# Altium footprint library IntegratedPcbLib.PcbLib: 81 footprints (part 5 of 6)
Each footprint in its own frame and in the unit in brackets; x right, y up, seen from the top. Pads: shape width x height; smd on the part's side, far side on the other; paste and mask are expansions set on the pad; w line width, h text height; cw(c..) or ccw(c..) is an arc to the next point about the centre after c.
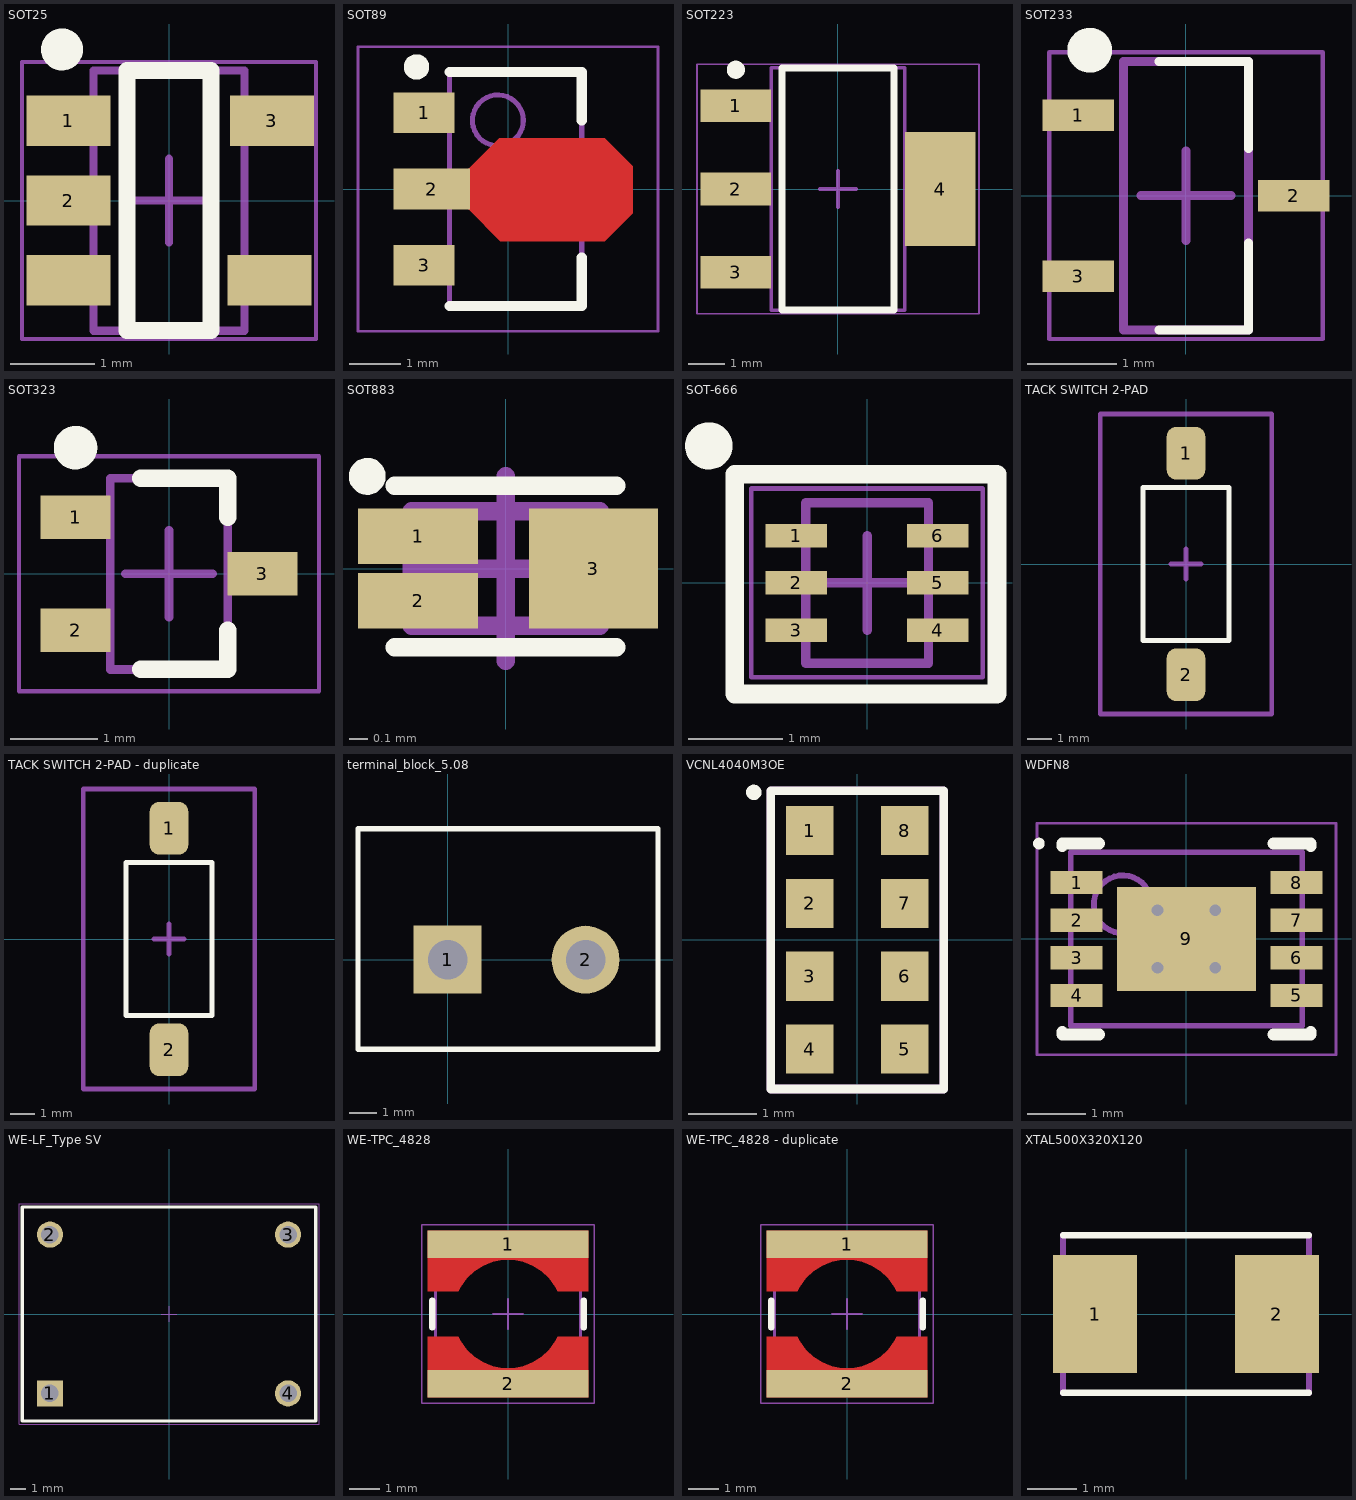
[diagram p4: the footprints below, top view; thin cyan lines are the x and y axes]

## SOT25 [mm]
height 1.3
pads (5):
  rect 1x0.6 smd: 1(-1.2,0.95) 2(-1.2,0) 3(1.225,0.95) ""(-1.2,-0.95) ""(1.2,-0.95)
Top Overlay:
  circle w0.25: c-1.275,1.8 r0.125
  lines w0.2: -0.5,-1.55 -0.5,1.55 0.5,1.55 0.5,-1.55 -0.5,-1.55
Mechanical 13:
  lines w0.1: -0.9,-1.55 0.9,-1.55 0.9,1.55 -0.9,1.55 -0.9,-1.55
Mechanical 15:
  lines w0.05: -1.75,-1.65 1.75,-1.65 1.75,1.65 -1.75,1.65 -1.75,-1.65
  lines w0.1: -0.5,0 0.5,0 ; 0,-0.5 0,0.5
3D body "SOT25.step": height 1.3, standoff 0, extent -1.5,-1.55 1.5,1.55

## SOT89 [mm] "SOT89, 3-Leads, Body 4,50x2,50mm, Pitch 1,50mm, Lead Span 3,5mm, IPC Low Density"
height 1.6
pads (3):
  rect 1.2x0.8 smd: 1(-1.65,1.5) 3(-1.65,-1.5)
  rect 1.5x0.8 smd: 2(-1.5,0)
Top Layer:
  region: -0.775,0.4 -0.175,1 1.9,1 2.45,0.45 2.45,-0.475 1.9,-1.025 -0.15,-1.025 -0.775,-0.4
Top Overlay:
  circle w0.25: c-1.8,2.4 r0.125
  lines w0.2: -1.15,-2.3 1.45,-2.3 1.45,-1.35 ; -1.15,2.3 1.45,2.3 1.45,1.35
Mechanical 13:
  circle w0.1: c-0.2,1.35 r0.5
  lines w0.1: -1.15,-2.3 1.45,-2.3 1.45,2.3 -1.15,2.3 -1.15,-2.3
Mechanical 15:
  lines w0.05: -2.95,-2.8 2.95,-2.8 2.95,2.8 -2.95,2.8 -2.95,-2.8
  lines w0.1: -0.175,0 0.825,0 ; 0.325,-0.5 0.325,0.5
3D body "SOT89.step": height 1.6, standoff 0, extent -2.2,-2.3 1.85,2.3

## SOT223 [mm] "SOT223, 4-Leads, Body 6,50x7,00mm (avg), Pitch 2,30mm, IPC High Density"
height 1.8
pads (4):
  rect 1.95x0.9 smd: 1(-2.825,2.3) 2(-2.825,0) 3(-2.825,-2.3)
  rect 1.95x3.15 smd: 4(2.825,0)
Top Overlay:
  circle w0.25: c-2.825,3.3 r0.125
  lines w0.2: -1.55,-3.35 1.55,-3.35 1.55,3.35 -1.55,3.35 -1.55,-3.35
Mechanical 13:
  lines w0.1: -1.85,-3.35 1.85,-3.35 1.85,3.35 -1.85,3.35 -1.85,-3.35
Mechanical 15:
  lines w0.05: -3.9,-3.45 3.9,-3.45 3.9,3.45 -3.9,3.45 -3.9,-3.45
  lines w0.1: -0.5,0 0.5,0 ; 0,-0.5 0,0.5
3D body "SOT223.step": height 1.8, standoff 0, extent -3.5,-3.35 3.5,3.35

## SOT233 [mm]
height 1.1
pads (3):
  rect 0.8x0.35 smd: 1(-1.202,0.9) 2(1.202,0) 3(-1.202,-0.9)
Top Overlay:
  circle w0.25: c-1.075,1.625 r0.125
  lines w0.1: -0.3,-1.5 0.7,-1.5 0.7,-0.525 ; -0.3,1.5 0.7,1.5 0.7,0.525
Mechanical 13:
  lines w0.1: -0.7,-1.5 0.7,-1.5 0.7,1.5 -0.7,1.5 -0.7,-1.5
Mechanical 15:
  lines w0.05: -1.525,-1.6 1.525,-1.6 1.525,1.6 -1.525,1.6 -1.525,-1.6
  lines w0.1: -0.5,0 0.5,0 ; 0,-0.5 0,0.5
3D body "User Library-SOT23-3.step": height 1.3, standoff 0, extent -1.4,-1.45 1.4,1.45

## SOT323 [mm] "SOT323, 3-Leads, Body 2,00x2,10mm, Pitch 0,65mm, IPC Medium Density"
height 1.1
pads (3):
  rect 0.8x0.5 smd: 1(-1.075,0.65) 2(-1.075,-0.65) 3(1.075,0)
Top Overlay:
  circle w0.25: c-1.075,1.45 r0.125
  lines w0.2: -0.325,-1.1 0.675,-1.1 0.675,-0.65 ; -0.325,1.1 0.675,1.1 0.675,0.65
Mechanical 13:
  lines w0.1: -0.675,-1.1 0.675,-1.1 0.675,1.1 -0.675,1.1 -0.675,-1.1
Mechanical 15:
  lines w0.05: -1.725,-1.35 1.725,-1.35 1.725,1.35 -1.725,1.35 -1.725,-1.35
  lines w0.1: -0.5,0 0.5,0 ; 0,-0.5 0,0.5
3D body "SOT323.step": height 1.1, standoff 0, extent -1.1,-1.1 1.1,1.1

## SOT883 [mm] "DFN, 3-Leads, Body 0,59x0,99mm, Pitch 0,65mm, IPC Medium Density"
height 0.5
pads (3):
  rect 0.65x0.3 smd: 1(-0.475,0.175) 2(-0.475,-0.175)
  rect 0.7x0.65 smd: 3(0.475,0)
Top Overlay:
  circle w0.1: c-0.75,0.5 r0.05
  lines w0.1: -0.6,-0.425 0.6,-0.425 ; -0.6,0.45 0.6,0.45
Mechanical 13:
  lines w0.1: -0.51,-0.31 0.51,-0.31 0.51,0.31 -0.51,0.31 -0.51,-0.31
Mechanical 15:
  lines w0.1: -0.5,0 0.5,0 ; 0,-0.5 0,0.5
3D body "SOT883.step": height 0.5, standoff 0, extent -0.51,-0.31 0.51,0.31

## SOT-666 [mm] "SOT-666 6-Leads, Body 1,60x1,60mm, Pitch 0,50mm, IPC Medium Density"
height 0.6
pads (6):
  rect 0.65x0.25 smd: 1(-0.75,0.5) 2(-0.75,0) 3(-0.75,-0.5) 4(0.75,-0.5) 5(0.75,0) 6(0.75,0.5)
Top Overlay:
  circle w0.25: c-1.675,1.45 r0.125
  lines w0.2: -1.4,-1.175 1.375,-1.175 1.375,1.15 -1.4,1.15 -1.4,-1.175
Mechanical 13:
  lines w0.1: -0.65,-0.85 -0.65,0.85 0.65,0.85 0.65,-0.85 -0.65,-0.85
Mechanical 15:
  lines w0.05: -1.225,-1 -1.225,1 1.225,1 1.225,-1 -1.225,-1
  lines w0.1: -0.5,0 0.5,0 ; 0,-0.5 0,0.5
3D body "User Library-SOT50P160X60-6.step": height 0.55, standoff -0.05, extent -0.8,-0.795 0.8,0.795

## TACK SWITCH 2-PAD [mm]
height 4.42
pads (2):
  rrect50% 1.6x2.19 smd: 1(0,4.595) 2(0,-4.595)
Top Overlay:
  lines w0.2: -1.778,-3.175 -1.778,3.175 1.778,3.175 1.778,-3.175 -1.778,-3.175
Mechanical 15:
  lines w0.2: -0.635,0 0.635,0 ; 0,-0.635 0,0.635 ; -3.556,-6.223 3.556,-6.223 3.556,6.223 -3.556,6.223 -3.556,-6.223
3D body "FSMSMTR.STEP": height 4.42, standoff 0, extent -1.75,-4.984 1.75,4.985

## TACK SWITCH 2-PAD - duplicate [mm]
height 4.42
pads (2):
  rrect50% 1.6x2.19 smd: 1(0,4.595) 2(0,-4.595)
Top Overlay:
  lines w0.2: -1.778,-3.175 -1.778,3.175 1.778,3.175 1.778,-3.175 -1.778,-3.175
Mechanical 15:
  lines w0.2: -0.635,0 0.635,0 ; 0,-0.635 0,0.635 ; -3.556,-6.223 3.556,-6.223 3.556,6.223 -3.556,6.223 -3.556,-6.223
3D body "FSMSMTR.STEP": height 4.42, standoff 0, extent -1.75,-4.984 1.75,4.985

## terminal_block_5.08 [mm] "Connector; Header;"
pads (2):
  rect 2.5x2.5 hole 1.45: 1(0,0)
  round 2.5 hole 1.45: 2(5.08,0)
Top Overlay:
  lines w0.2: -3.302,-3.302 -3.302,4.826 7.747,4.826 7.747,-3.302 -3.302,-3.302
3D body "User Library-Terminal-Screw-3A-2way.step": height 10, standoff -3, extent -3.06,-3.038 7.54,4.562

## VCNL4040M3OE [mm]
pads (8):
  rect 0.7x0.725 smd: 1(-0.7,1.613) 2(-0.7,0.537) 3(-0.7,-0.537) 4(-0.7,-1.613) 5(0.7,-1.613) 6(0.7,-0.537) 7(0.7,0.537) 8(0.7,1.613)
Top Overlay:
  circle w0.127: c-1.525,2.175 r0.05
  lines w0.127: -1.275,-2.2 1.275,-2.2 1.275,2.2 -1.275,2.2 -1.275,-2.2
Mechanical 4:
  lines w0.127: -1.275,-2.2 1.275,-2.2 1.275,2.2 -1.275,2.2 -1.275,-2.2
3D body "User Library-VCNL4040.STEP": height 1.1, standoff 0, extent -1,-2 1,2

## WDFN8 [mm] "WDFN8 , 8-Leads, Body 3,00x4,00mm, Pitch 0,65mm, Thermal Pad 1,80x2,40mm, IPC Low Density"
height 0.8
pads (9):
  rect 0.9x0.4 smd: 1(-1.9,0.975) 2(-1.9,0.325) 3(-1.9,-0.325) 4(-1.9,-0.975) 5(1.9,-0.975) 6(1.9,-0.325) 7(1.9,0.325) 8(1.9,0.975)
  rect 2.4x1.8 smd: 9(0,0)
via 0.5,-0.5 diameter 0.5 hole 0.2
via -0.5,-0.5 diameter 0.5 hole 0.2
via 0.5,0.5 diameter 0.5 hole 0.2
via -0.5,0.5 diameter 0.5 hole 0.2
Top Overlay:
  circle w0.1: c-2.55,1.65 r0.05
  lines w0.2: -2.15,-1.6 -2.15,-1.65 -1.505,-1.65 ; -2.15,1.6 -2.15,1.65 -1.505,1.65 ; 1.505,-1.65 2.15,-1.65 2.15,-1.6 ; 1.505,1.65 2.15,1.65 2.15,1.6
Mechanical 13:
  circle w0.1: c-1.1,0.6 r0.5
  lines w0.1: -2,-1.5 2,-1.5 2,1.5 -2,1.5 -2,-1.5
Mechanical 15:
  lines w0.05: -2.585,-2 2.585,-2 2.585,2 -2.585,2 -2.585,-2
  lines w0.1: -0.5,0 0.5,0 ; 0,-0.5 0,0.5
3D body "WDFN8 .step": height 0.8, standoff 0, extent -2.001,-1.5 2.001,1.5

## WE-LF_Type SV [mm] "Common Mode Power Line Choke, THT, 4-leads, body 18.5x13.5mm"
height 20.5
pads (4):
  rect 1.65x1.65 hole 1.1: 1(-7.5,-5)
  round 1.65 hole 1.1: 2(-7.5,5) 3(7.5,5) 4(7.5,-5)
Top Overlay:
  lines w0.2: -9.25,-6.75 -9.25,6.75 9.25,6.75 9.25,-6.75 -9.25,-6.75
Mechanical 13:
  lines w0.1: -9.25,-6.75 9.25,-6.75 9.25,6.75 -9.25,6.75 -9.25,-6.75
Mechanical 15:
  lines w0.05: -0.5,0 0.5,0 ; 0,-0.5 0,0.5 ; -9.45,-6.95 -9.45,6.95 9.45,6.95 9.45,-6.95 -9.45,-6.95
3D body "7446120039.stp": height 20.55, standoff -2.95, extent -9.25,-6.75 9.25,6.75

## WE-TPC_4828 [mm] "Power Inductor, SMD, 2-Leads, body 4.8x4.8mm"
height 3
pads (2):
  rect 5.3x0.9 smd paste-403.566 mask-403.566: 1(0,2.3) 2(0,-2.3)
Top Layer:
  region: 2.65,-0.75 1.636,-0.75 1.558,-0.902 1.359,-1.18 1.112,-1.416 0.824,-1.6 0.506,-1.727 0.171,-1.792 -0.171,-1.792 -0.507,-1.727 -0.824,-1.6 -1.112,-1.416 -1.359,-1.18 -1.558,-0.902 -1.636,-0.75 -2.65,-0.75 -2.65,-2.75 2.65,-2.75
  region: -2.65,0.75 -1.636,0.75 -1.558,0.902 -1.359,1.18 -1.112,1.416 -0.824,1.6 -0.506,1.727 -0.171,1.792 0.171,1.792 0.507,1.727 0.824,1.6 1.112,1.416 1.359,1.18 1.558,0.902 1.636,0.75 2.65,0.75 2.65,2.75 -2.65,2.75
Top Overlay:
  lines w0.2: -2.5,-0.45 -2.5,0.45 ; 2.5,-0.45 2.5,0.45
Mechanical 13:
  lines w0.1: -2.4,-2.4 -2.4,2.4 2.4,2.4 2.4,-2.4 -2.4,-2.4
Mechanical 15:
  lines w0.05: -0.5,0 0.5,0 ; 0,-0.5 0,0.5 ; -2.85,-2.95 -2.85,2.95 2.85,2.95 2.85,-2.95 -2.85,-2.95
3D body "744043xxx.stp": height 2.8, standoff 0, extent -2.4,-2.4 2.4,2.4

## WE-TPC_4828 - duplicate [mm] "Power Inductor, SMD, 2-Leads, body 4.8x4.8mm"
height 3
pads (2):
  rect 5.3x0.9 smd paste-403.566 mask-403.566: 1(0,2.3) 2(0,-2.3)
Top Layer:
  region: 2.65,-0.75 1.636,-0.75 1.558,-0.902 1.359,-1.18 1.112,-1.416 0.824,-1.6 0.506,-1.727 0.171,-1.792 -0.171,-1.792 -0.507,-1.727 -0.824,-1.6 -1.112,-1.416 -1.359,-1.18 -1.558,-0.902 -1.636,-0.75 -2.65,-0.75 -2.65,-2.75 2.65,-2.75
  region: -2.65,0.75 -1.636,0.75 -1.558,0.902 -1.359,1.18 -1.112,1.416 -0.824,1.6 -0.506,1.727 -0.171,1.792 0.171,1.792 0.507,1.727 0.824,1.6 1.112,1.416 1.359,1.18 1.558,0.902 1.636,0.75 2.65,0.75 2.65,2.75 -2.65,2.75
Top Overlay:
  lines w0.2: -2.5,-0.45 -2.5,0.45 ; 2.5,-0.45 2.5,0.45
Mechanical 13:
  lines w0.1: -2.4,-2.4 -2.4,2.4 2.4,2.4 2.4,-2.4 -2.4,-2.4
Mechanical 15:
  lines w0.05: -0.5,0 0.5,0 ; 0,-0.5 0,0.5 ; -2.85,-2.95 -2.85,2.95 2.85,2.95 2.85,-2.95 -2.85,-2.95
3D body "744043xxx.stp": height 2.8, standoff 0, extent -2.4,-2.4 2.4,2.4

## XTAL500X320X120 [mm]
pads (2):
  rect 1.7x2.4 smd: 1(-1.85,0) 2(1.85,0)
Top Overlay:
  lines w0.127: -2.5,-1.6 2.5,-1.6 ; -2.5,1.6 2.5,1.6
Mechanical 4:
  circle w0: c-2,0 r0.25
  circle w0: c-2,0 r0.25
  lines w0.127: -2.5,-1.6 -2.5,1.6 -2.5,-1.6 ; 2.5,-1.6 2.5,1.6 2.5,-1.6
3D body "User Library-Crystal TXC 7A Series.step": height 1.25, standoff 0, extent -2.5,-1.575 2.5,1.625